# Altium schematic symbol library Library.SchLib: 802 symbols (part 4 of 8)
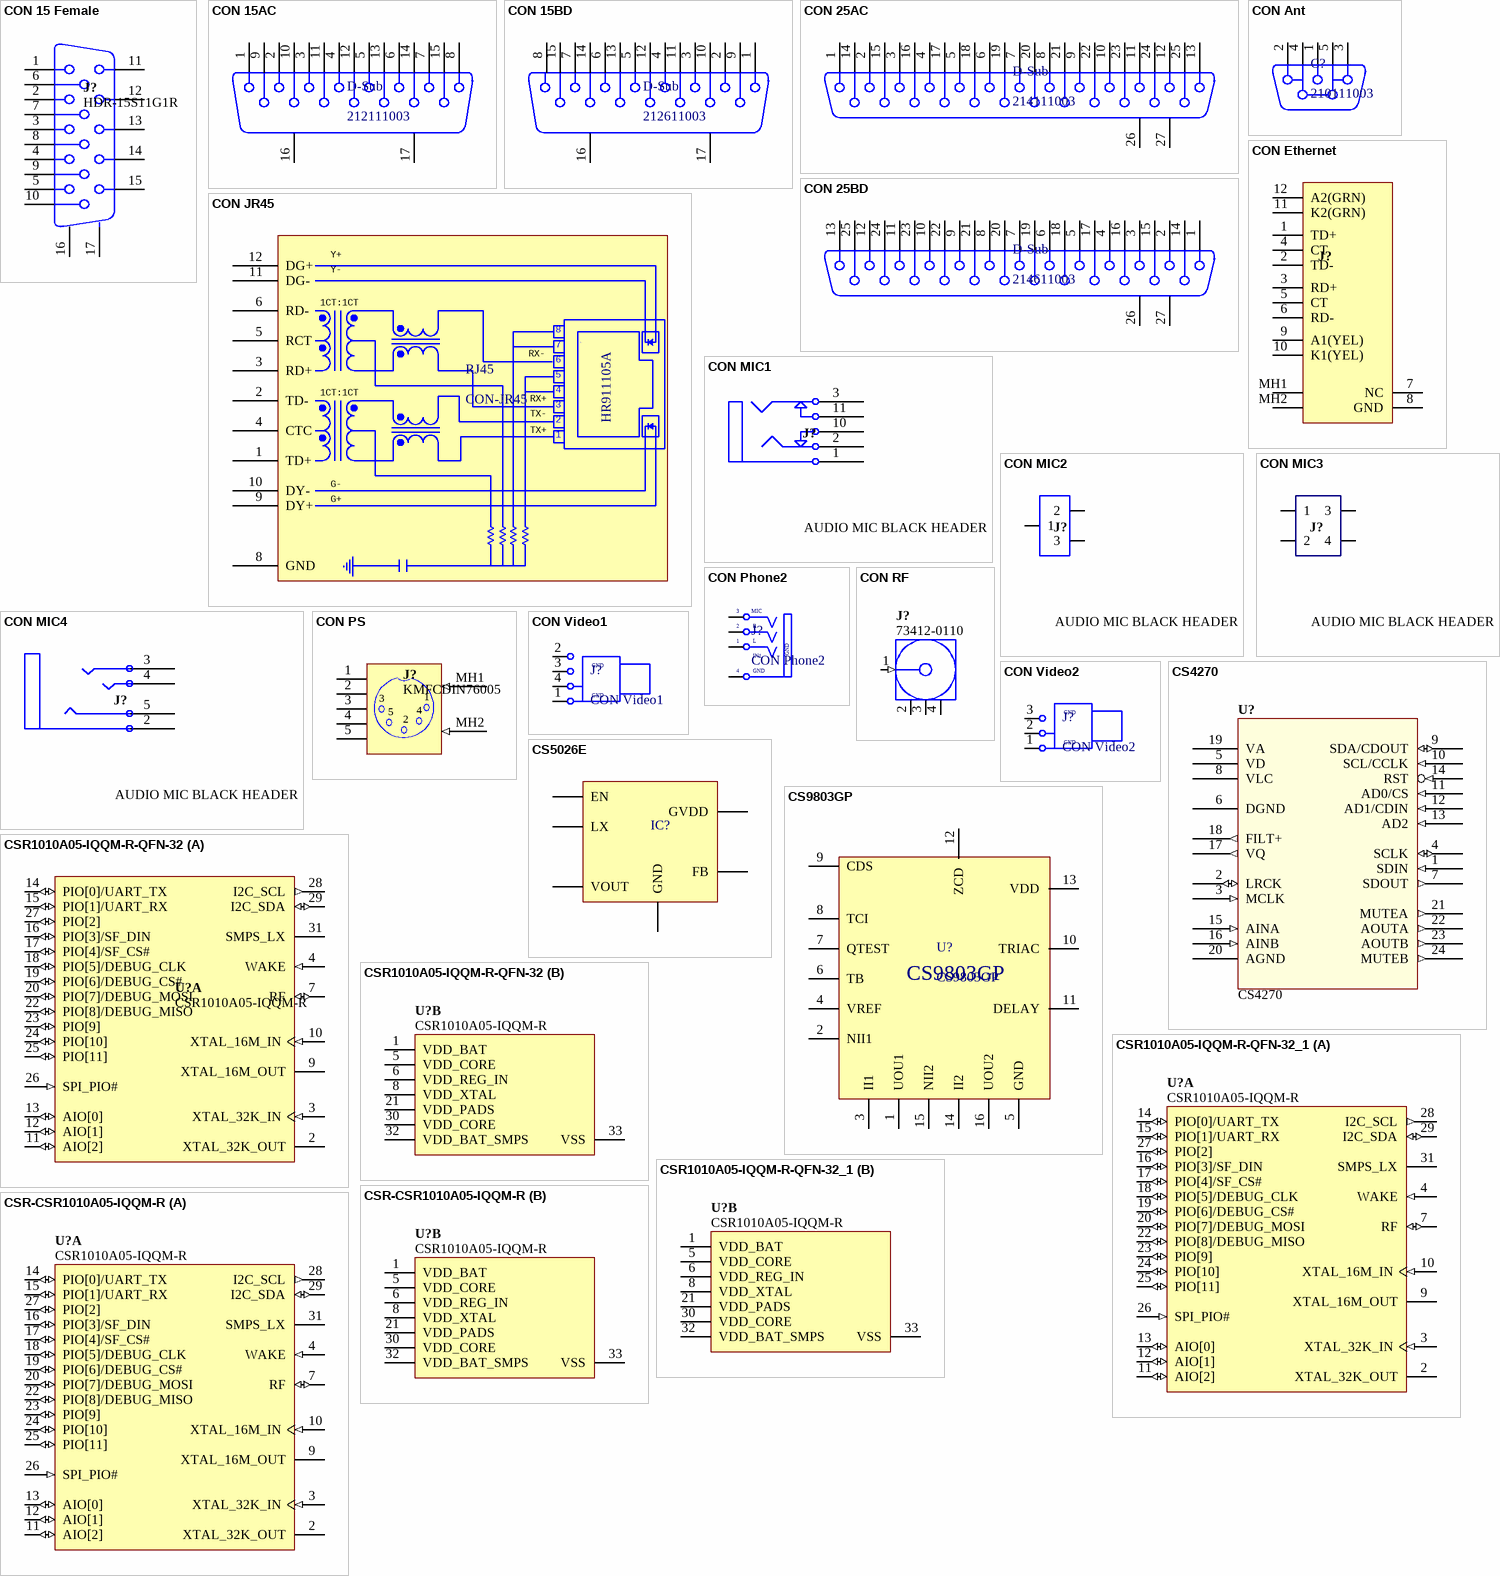
[diagram p52: symbols CON 15 Female to CSR-CSR1010A05-IQQM-R]

## CSR1010A05-IQQM-R-QFN-32
designator U?, comment CSR1010A05-IQQM-R
Bluetooth Low Energy Single-mode IC, 64 KB RAM and 64 KB ROM, -30 to 85 degC, 32-pin QFN; Manufacturer: CSR; Stop bits No.: 1 or 2; I/O Supply Voltage (VDD_PADS): 1.2 to 3.6 V; Digital IO No.: 12; Packing: Tape and Reel; Flow control: CTS / RTS; Bits per byte: 8; Baud Rate (max): 2Mbaud (<=1%Error); Baud Rate (min): 1200 baud (<=2%Error); ComponentLink2Description: Datasheet; ComponentLink2URL: https://www.csrsupport.com/download/39359/CSR1010%20Data%20Sheet%20CS-231985-DS.pdf; PartNumber: CSR1010A05-IQQM-R; DatasheetVersion: Rev. 4; Memory Size: 64KB RAM and 64KB ROM; ComponentLink3URL: https://www.csrsupport.com/download/39359/CSR1010%20Data%20Sheet%20CS-231985-DS.pdf; Mounting Technology: Surface Mount; Operating Temperature: -30 to 85 degC; PackageDescription: 32-Pin Quad Flat No-lead Package, Body 5x5mm, Pitch 0.5mm; ComponentLink1URL: http://csr.com/; PackageReference: QFN-32; ComponentLink3Description: Package Specification; ComponentLink1Description: Manufacturer URL
footprint QFN32 (QFN, 32-Leads, Body 5x5 mm, Pitch 0.5mm, IPC High Density)
part A pins: 2 XTAL_32K_OUT "Drive for sleep clock crystal.", 3 XTAL_32K_IN (in) "32.768kHz sleep clock input.", 4 WAKE (in) "Input to wake CSR1010 QFN from hibernate or dormant.", 7 RF (io) "Bluetooth transmitter / receiver.", 9 XTAL_16M_OUT "Drive for crystal.", 10 XTAL_16M_IN (in) "Reference clock input.", 11 AIO[2] (io) "Analogue programmable I/O line.", 12 AIO[1] (io) "Analogue programmable I/O line.", 13 AIO[0] (io) "Analogue programmable I/O line.", 14 PIO[0]/UART_TX (io) "Programmable I/O line or UART TX.", 15 PIO[1]/UART_RX (io) "Programmable I/O line or UART RX.", 16 PIO[3]/SF_DIN (io) "Programmable I/O line or SPI serial flash data (SF_DIN) input. If connecting to SPI serial flash, this pin connects to SI on the serial flash. See Section 5.3.", 17 PIO[4]/SF_CS# (io) "Programmable I/O line or SPI serial flash chip select (SF_CS#), see Section 5.3.", 18 PIO[5]/DEBUG_CLK (io) "Programmable I/O line or debug SPI CLK selected by SPI_PIO#.", 19 PIO[6]/DEBUG_CS# (io) "Programmable I/O line or debug SPI chip select (CS#) selected by SPI_PIO#.", 20 PIO[7]/DEBUG_MOSI (io) "Programmable I/O line or debug SPI MOSI selected by SPI_PIO#.", 22 PIO[8]/DEBUG_MISO (io) "Programmable I/O line or debug SPI MISO selected by SPI_PIO#.", 23 PIO[9] (io) "Programmable I/O line.", 24 PIO[10] (io) "Programmable I/O line.", 25 PIO[11] (io) "Programmable I/O line.", 26 SPI_PIO# (in) "Selects SPI debug on PIO[8:5].", 27 PIO[2] (io) "Programmable I/O line or I2C power.", 28 I2C_SCL (out) "I2C clock or SPI serial flash clock output (SF_CLK), see Section 5.3.", 29 I2C_SDA (io) "I2C data input / output or SPI serial flash data output (SF_DOUT). If connecting to SPI serial flash, connect this pin to SO on the serial flash. See Section 5.3.", 31 SMPS_LX (power) "High-voltage switch-mode regulator output."
part B pins: 1 VDD_BAT (power) "Battery input and regulator enable (active high).", 5 VDD_CORE (power) "Positive supply for digital domain.", 6 VDD_REG_IN (power) "Positive supply for Bluetooth radio and digital linear regulator.", 8 VDD_XTAL (power) "Decouple with 470nF capacitor to ground.", 21 VDD_PADS (power) "Positive supply for all digital I/O ports PIO[11:0].", 30 VDD_CORE (power) "Positive supply for digital domain.", 32 VDD_BAT_SMPS (power) "Input to high-voltage switch-mode regulator.", 33 VSS (power) "Ground connections."

## CSR1010A05-IQQM-R-QFN-32_1
designator U?, comment CSR1010A05-IQQM-R
Bluetooth Low Energy Single-mode IC, 64 KB RAM and 64 KB ROM, -30 to 85 degC, 32-pin QFN; Manufacturer: CSR; Stop bits No.: 1 or 2; I/O Supply Voltage (VDD_PADS): 1.2 to 3.6 V; Digital IO No.: 12; Packing: Tape and Reel; Flow control: CTS / RTS; Bits per byte: 8; Baud Rate (max): 2Mbaud (<=1%Error); Baud Rate (min): 1200 baud (<=2%Error); ComponentLink2Description: Datasheet; ComponentLink2URL: https://www.csrsupport.com/download/39359/CSR1010%20Data%20Sheet%20CS-231985-DS.pdf; PartNumber: CSR1010A05-IQQM-R; DatasheetVersion: Rev. 4; Memory Size: 64KB RAM and 64KB ROM; ComponentLink3URL: https://www.csrsupport.com/download/39359/CSR1010%20Data%20Sheet%20CS-231985-DS.pdf; Mounting Technology: Surface Mount; Operating Temperature: -30 to 85 degC; PackageDescription: 32-Pin Quad Flat No-lead Package, Body 5x5mm, Pitch 0.5mm; ComponentLink1URL: http://csr.com/; PackageReference: QFN-32; ComponentLink3Description: Package Specification; ComponentLink1Description: Manufacturer URL
footprint QFN32 (QFN, 32-Leads, Body 5x5 mm, Pitch 0.5mm, IPC High Density)
part A pins: 2 XTAL_32K_OUT "Drive for sleep clock crystal.", 3 XTAL_32K_IN (in) "32.768kHz sleep clock input.", 4 WAKE (in) "Input to wake CSR1010 QFN from hibernate or dormant.", 7 RF (io) "Bluetooth transmitter / receiver.", 9 XTAL_16M_OUT "Drive for crystal.", 10 XTAL_16M_IN (in) "Reference clock input.", 11 AIO[2] (io) "Analogue programmable I/O line.", 12 AIO[1] (io) "Analogue programmable I/O line.", 13 AIO[0] (io) "Analogue programmable I/O line.", 14 PIO[0]/UART_TX (io) "Programmable I/O line or UART TX.", 15 PIO[1]/UART_RX (io) "Programmable I/O line or UART RX.", 16 PIO[3]/SF_DIN (io) "Programmable I/O line or SPI serial flash data (SF_DIN) input. If connecting to SPI serial flash, this pin connects to SI on the serial flash. See Section 5.3.", 17 PIO[4]/SF_CS# (io) "Programmable I/O line or SPI serial flash chip select (SF_CS#), see Section 5.3.", 18 PIO[5]/DEBUG_CLK (io) "Programmable I/O line or debug SPI CLK selected by SPI_PIO#.", 19 PIO[6]/DEBUG_CS# (io) "Programmable I/O line or debug SPI chip select (CS#) selected by SPI_PIO#.", 20 PIO[7]/DEBUG_MOSI (io) "Programmable I/O line or debug SPI MOSI selected by SPI_PIO#.", 22 PIO[8]/DEBUG_MISO (io) "Programmable I/O line or debug SPI MISO selected by SPI_PIO#.", 23 PIO[9] (io) "Programmable I/O line.", 24 PIO[10] (io) "Programmable I/O line.", 25 PIO[11] (io) "Programmable I/O line.", 26 SPI_PIO# (in) "Selects SPI debug on PIO[8:5].", 27 PIO[2] (io) "Programmable I/O line or I2C power.", 28 I2C_SCL (out) "I2C clock or SPI serial flash clock output (SF_CLK), see Section 5.3.", 29 I2C_SDA (io) "I2C data input / output or SPI serial flash data output (SF_DOUT). If connecting to SPI serial flash, connect this pin to SO on the serial flash. See Section 5.3.", 31 SMPS_LX (power) "High-voltage switch-mode regulator output."
part B pins: 1 VDD_BAT (power) "Battery input and regulator enable (active high).", 5 VDD_CORE (power) "Positive supply for digital domain.", 6 VDD_REG_IN (power) "Positive supply for Bluetooth radio and digital linear regulator.", 8 VDD_XTAL (power) "Decouple with 470nF capacitor to ground.", 21 VDD_PADS (power) "Positive supply for all digital I/O ports PIO[11:0].", 30 VDD_CORE (power) "Positive supply for digital domain.", 32 VDD_BAT_SMPS (power) "Input to high-voltage switch-mode regulator.", 33 VSS (power) "Ground connections."

## CSR-CSR1010A05-IQQM-R
designator U?, comment CSR1010A05-IQQM-R
Bluetooth Low Energy Single-mode IC, 64 KB RAM and 64 KB ROM, -30 to 85 degC, 32-pin QFN; Manufacturer: CSR; Stop bits No.: 1 or 2; I/O Supply Voltage (VDD_PADS): 1.2 to 3.6 V; Digital IO No.: 12; Packing: Tape and Reel; Flow control: CTS / RTS; Bits per byte: 8; Baud Rate (max): 2Mbaud (<=1%Error); Baud Rate (min): 1200 baud (<=2%Error); ComponentLink2Description: Datasheet; ComponentLink2URL: https://www.csrsupport.com/download/39359/CSR1010%20Data%20Sheet%20CS-231985-DS.pdf; PartNumber: CSR1010A05-IQQM-R; DatasheetVersion: Rev. 4; Memory Size: 64KB RAM and 64KB ROM; ComponentLink3URL: https://www.csrsupport.com/download/39359/CSR1010%20Data%20Sheet%20CS-231985-DS.pdf; Mounting Technology: Surface Mount; Operating Temperature: -30 to 85 degC; PackageDescription: 32-Pin Quad Flat No-lead Package, Body 5x5mm, Pitch 0.5mm; ComponentLink1URL: http://csr.com/; PackageReference: QFN-32; ComponentLink3Description: Package Specification; ComponentLink1Description: Manufacturer URL
footprint QFN32 (QFN, 32-Leads, Body 5x5 mm, Pitch 0.5mm, IPC High Density)
part A pins: 2 XTAL_32K_OUT "Drive for sleep clock crystal.", 3 XTAL_32K_IN (in) "32.768kHz sleep clock input.", 4 WAKE (in) "Input to wake CSR1010 QFN from hibernate or dormant.", 7 RF (io) "Bluetooth transmitter / receiver.", 9 XTAL_16M_OUT "Drive for crystal.", 10 XTAL_16M_IN (in) "Reference clock input.", 11 AIO[2] (io) "Analogue programmable I/O line.", 12 AIO[1] (io) "Analogue programmable I/O line.", 13 AIO[0] (io) "Analogue programmable I/O line.", 14 PIO[0]/UART_TX (io) "Programmable I/O line or UART TX.", 15 PIO[1]/UART_RX (io) "Programmable I/O line or UART RX.", 16 PIO[3]/SF_DIN (io) "Programmable I/O line or SPI serial flash data (SF_DIN) input. If connecting to SPI serial flash, this pin connects to SI on the serial flash. See Section 5.3.", 17 PIO[4]/SF_CS# (io) "Programmable I/O line or SPI serial flash chip select (SF_CS#), see Section 5.3.", 18 PIO[5]/DEBUG_CLK (io) "Programmable I/O line or debug SPI CLK selected by SPI_PIO#.", 19 PIO[6]/DEBUG_CS# (io) "Programmable I/O line or debug SPI chip select (CS#) selected by SPI_PIO#.", 20 PIO[7]/DEBUG_MOSI (io) "Programmable I/O line or debug SPI MOSI selected by SPI_PIO#.", 22 PIO[8]/DEBUG_MISO (io) "Programmable I/O line or debug SPI MISO selected by SPI_PIO#.", 23 PIO[9] (io) "Programmable I/O line.", 24 PIO[10] (io) "Programmable I/O line.", 25 PIO[11] (io) "Programmable I/O line.", 26 SPI_PIO# (in) "Selects SPI debug on PIO[8:5].", 27 PIO[2] (io) "Programmable I/O line or I2C power.", 28 I2C_SCL (out) "I2C clock or SPI serial flash clock output (SF_CLK), see Section 5.3.", 29 I2C_SDA (io) "I2C data input / output or SPI serial flash data output (SF_DOUT). If connecting to SPI serial flash, connect this pin to SO on the serial flash. See Section 5.3.", 31 SMPS_LX (power) "High-voltage switch-mode regulator output."
part B pins: 1 VDD_BAT (power) "Battery input and regulator enable (active high).", 5 VDD_CORE (power) "Positive supply for digital domain.", 6 VDD_REG_IN (power) "Positive supply for Bluetooth radio and digital linear regulator.", 8 VDD_XTAL (power) "Decouple with 470nF capacitor to ground.", 21 VDD_PADS (power) "Positive supply for all digital I/O ports PIO[11:0].", 30 VDD_CORE (power) "Positive supply for digital domain.", 32 VDD_BAT_SMPS (power) "Input to high-voltage switch-mode regulator.", 33 VSS (power) "Ground connections."

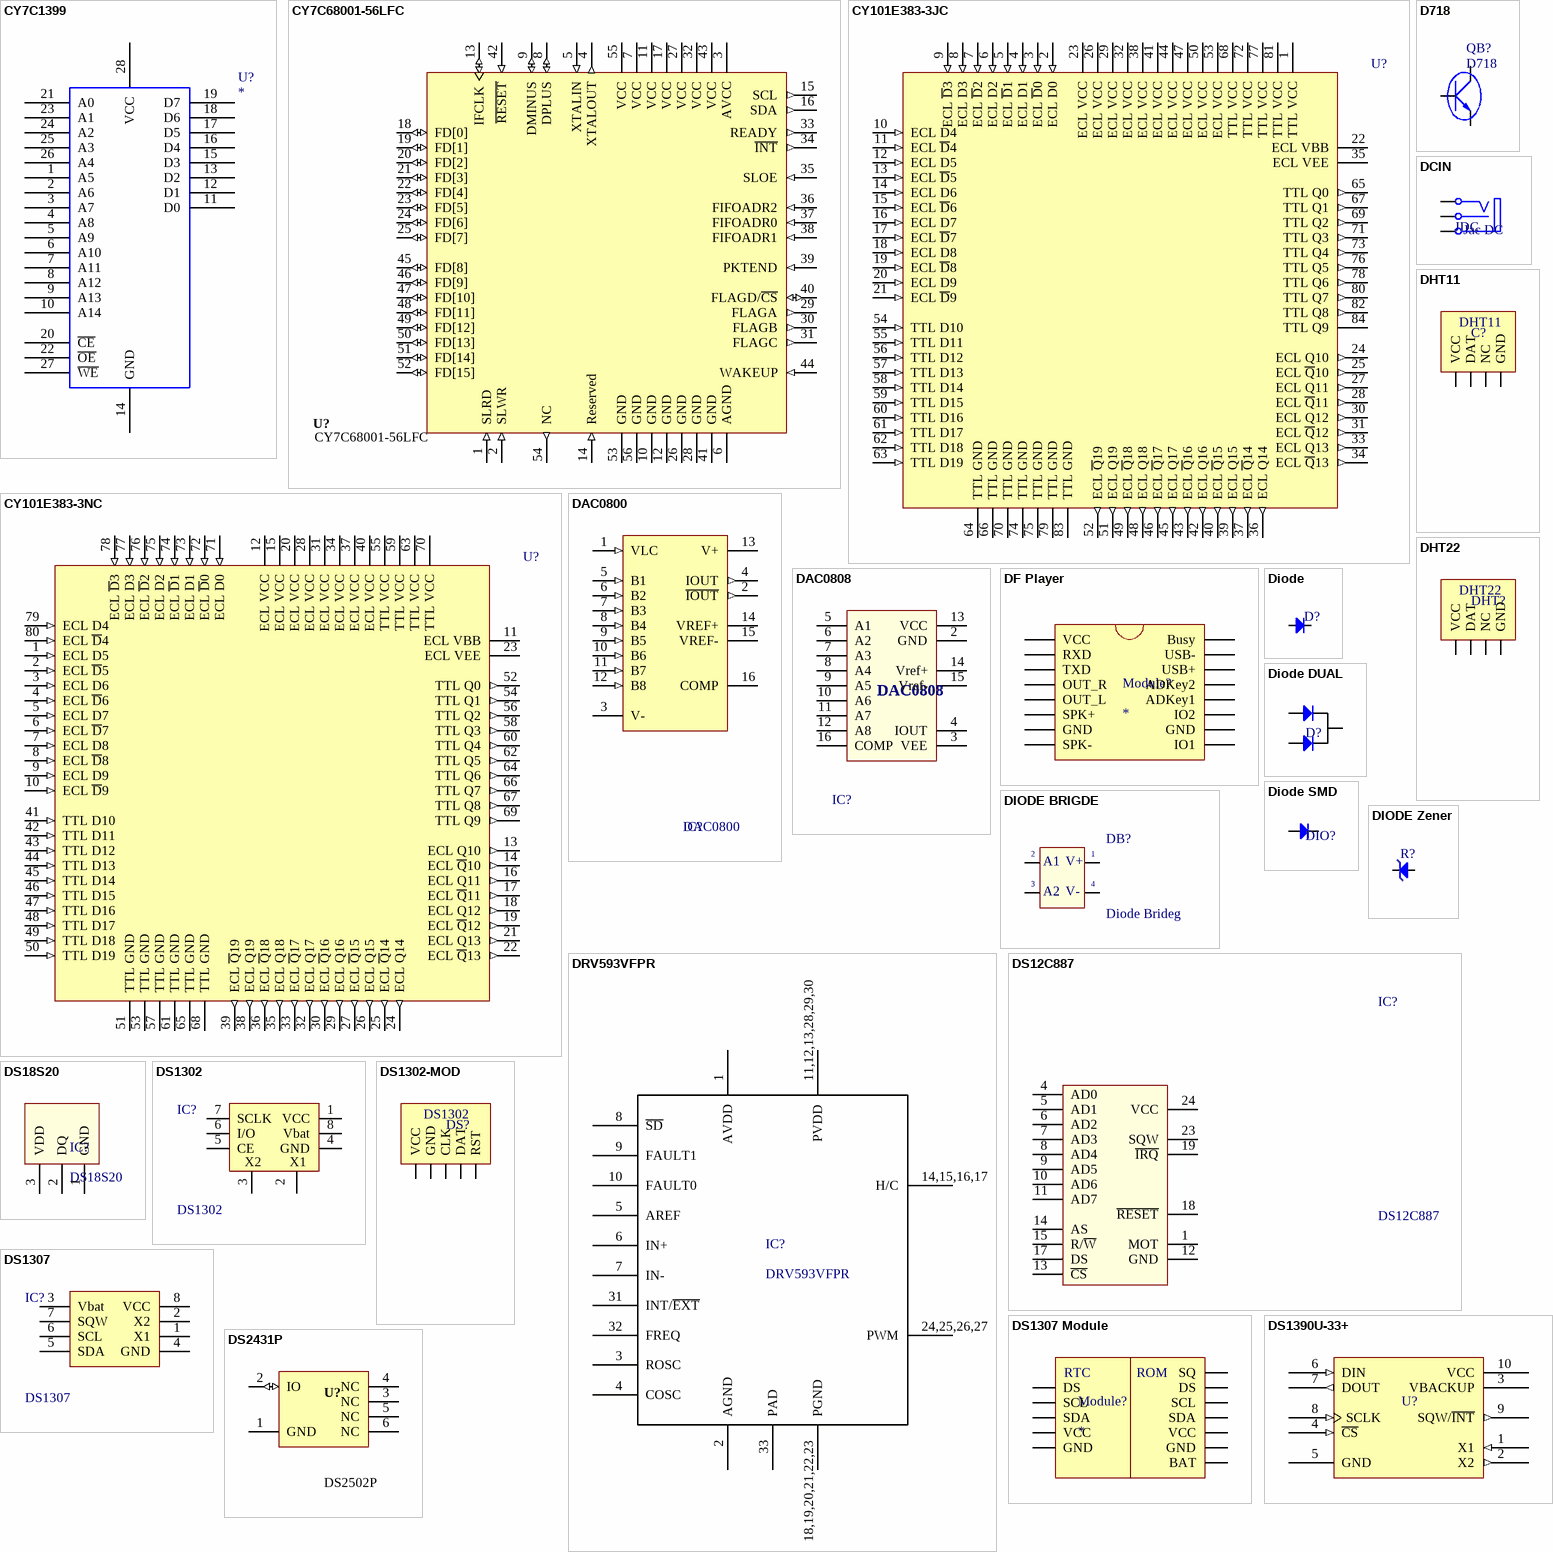
[diagram p20: symbols CY7C1399 to DS2431P]

## CY7C1399
designator U?
32K ASYNCHRONOUS SRAM
footprint SO28 (SOP, 28-Leads, Body 18.1x8.6mm, Pitch 1.27mm, IPC Low Density)
pins: 1 A5, 2 A6, 3 A7, 4 A8, 5 A9, 6 A10, 7 A11, 8 A12, 9 A13, 10 A14, 11 D0, 12 D1, 13 D2, 14 GND, 15 D3, 16 D4, 17 D5, 18 D6, 19 D7, 20 ~{CE}, 21 A0, 22 ~{OE}, 23 A1, 24 A2, 25 A3, 26 A4, 27 ~{WE}, 28 VCC

## CY7C68001-56LFC
designator U?
CY7C68001-56LFC, EZ-USB SX2 High-Speed USB Interface; Comm Standard: None; Category: IC-Communication; Mounting Technology: Surface Mount; Status: Production
footprint QFN56 (QFN, 56-Leads, Body 8.00x8.00mm, Pitch 0.50mm, Thermal Pad 6.40x6.40mm, IPC Medium Density)
pins: 1 SLRD (in), 2 SLWR (in), 3 AVCC (power), 4 XTALOUT (out), 5 XTALIN (in), 6 AGND (power), 7 VCC (power), 8 DPLUS (io), 9 DMINUS (io), 10 GND (power), 11 VCC (power), 12 GND (power), 13 IFCLK (io), 14 Reserved (in), 15 SCL (out), 16 SDA (out), 17 VCC (power), 18 FD[0] (io), 19 FD[1] (io), 20 FD[2] (io), 21 FD[3] (io), 22 FD[4] (io), 23 FD[5] (io), 24 FD[6] (io), 25 FD[7] (io), 26 GND (power), 27 VCC (power), 28 GND (power), 29 FLAGA (out), 30 FLAGB (out), 31 FLAGC (out), 32 VCC (power), 33 READY (out), 34 ~{INT} (out), 35 SLOE (in), 36 FIFOADR2 (in), 37 FIFOADR0 (in), 38 FIFOADR1 (in), 39 PKTEND (in), 40 FLAGD/~{CS} (io), 41 GND (power), 42 ~{RESET} (in), 43 VCC (power), 44 WAKEUP (in), 45 FD[8] (io), 46 FD[9] (io), 47 FD[10] (io), 48 FD[11] (io), 49 FD[12] (io), 50 FD[13] (io), 51 FD[14] (io), 52 FD[15] (io), 53 GND (power), 54 NC (out), 55 VCC (power), 56 GND (power)

## CY101E383-3JC
designator U?
ECL/TTL/ECL Translator and High-Speed Bus Driver; Published: 11-Dec-2002; LatestRevisionDate: 13-Apr-2006; LatestRevisionNote: IPC-7351 Footprint Added.; DatasheetVersion: 11-Apr-1997; PackageVersion: Mar-2001; PackageReference: J83; Publisher: Altium Limited; PackageDescription: 84-Pin Plastic Leaded Chip Carrier 1.27 mm Pitch; Code_IPC: PLCC-84; ComponentLink1Description: Manufacturer Link; ComponentLink1URL: http://www.cypress.com/
footprint LCC84 (Leaded Chip Carrier, 84-Leads, Body 29.3x29.3mm, Pitch 1.27mm, IPC High Density)
pins: 1 TTL VCC (power), 2 ECL D0 (in), 3 ECL ~{D}0 (in), 4 ECL D1 (in), 5 ECL ~{D}1 (in), 6 ECL D2 (in), 7 ECL ~{D}2 (in), 8 ECL D3 (in), 9 ECL ~{D}3 (in), 10 ECL D4 (in), 11 ECL ~{D}4 (in), 12 ECL D5 (in), 13 ECL ~{D}5 (in), 14 ECL D6 (in), 15 ECL ~{D}6 (in), 16 ECL D7 (in), 17 ECL ~{D}7 (in), 18 ECL D8 (in), 19 ECL ~{D}8 (in), 20 ECL D9 (in), 21 ECL ~{D}9 (in), 22 ECL VBB (power), 23 ECL VCC (power), 24 ECL Q10 (out), 25 ECL ~{Q}10 (out), 26 ECL VCC (power), 27 ECL Q11 (out), 28 ECL ~{Q}11 (out), 29 ECL VCC (power), 30 ECL Q12 (out), 31 ECL ~{Q}12 (out), 32 ECL VCC (power), 33 ECL Q13 (out), 34 ECL ~{Q}13 (out), 35 ECL VEE (power), 36 ECL Q14 (out), 37 ECL ~{Q}14 (out), 38 ECL VCC (power), 39 ECL Q15 (out), 40 ECL ~{Q}15 (out), 41 ECL VCC (power), 42 ECL Q16 (out), 43 ECL ~{Q}16 (out), 44 ECL VCC (power), 45 ECL Q17 (out), 46 ECL ~{Q}17 (out), 47 ECL VCC (power), 48 ECL Q18 (out), 49 ECL ~{Q}18 (out), 50 ECL VCC (power), 51 ECL Q19 (out), 52 ECL ~{Q}19 (out), 53 ECL VCC (power), 54 TTL D10 (in), 55 TTL D11 (in), 56 TTL D12 (in), 57 TTL D13 (in), 58 TTL D14 (in), 59 TTL D15 (in), 60 TTL D16 (in), 61 TTL D17 (in), 62 TTL D18 (in), 63 TTL D19 (in), 64 TTL GND (power), 65 TTL Q0 (out), 66 TTL GND (power), 67 TTL Q1 (out), 68 TTL VCC (power), 69 TTL Q2 (out), 70 TTL GND (power), 71 TTL Q3 (out), 72 TTL VCC (power), 73 TTL Q4 (out), 74 TTL GND (power), 75 TTL GND (power), 76 TTL Q5 (out), 77 TTL VCC (power), 78 TTL Q6 (out), 79 TTL GND (power), 80 TTL Q7 (out), 81 TTL VCC (power), 82 TTL Q8 (out), 83 TTL GND (power), 84 TTL Q9 (power)

## CY101E383-3NC
designator U?
ECL/TTL/ECL Translator and High-Speed Bus Driver; Published: 11-Dec-2002; LatestRevisionDate: 13-Apr-2006; LatestRevisionNote: IPC-7351 Footprint Added.; DatasheetVersion: 11-Apr-1997; PackageVersion: Apr-1997; PackageReference: N80; Publisher: Altium Limited; PackageDescription: 80-Pin Plastic Quad Flat Pack 0.65 mm Pitch; Code_IPC: QFP65P1720X1720-80; ComponentLink1Description: Manufacturer Link; ComponentLink1URL: http://www.cypress.com/
footprint QFP80 (QFP, 80-Leads, Body 14 x 14mm, Pitch 0.65mm, IPC High Density)
pins: 1 ECL D5 (in), 2 ECL ~{D}5 (in), 3 ECL D6 (in), 4 ECL ~{D}6 (in), 5 ECL D7 (in), 6 ECL ~{D}7 (in), 7 ECL D8 (in), 8 ECL ~{D}8 (in), 9 ECL D9 (in), 10 ECL ~{D}9 (in), 11 ECL VBB (power), 12 ECL VCC (power), 13 ECL Q10 (out), 14 ECL ~{Q}10 (out), 15 ECL VCC (power), 16 ECL Q11 (out), 17 ECL ~{Q}11 (out), 18 ECL Q12 (out), 19 ECL ~{Q}12 (out), 20 ECL VCC (power), 21 ECL Q13 (out), 22 ECL ~{Q}13 (out), 23 ECL VEE (power), 24 ECL Q14 (out), 25 ECL ~{Q}14 (out), 26 ECL Q15 (out), 27 ECL ~{Q}15 (out), 28 ECL VCC (power), 29 ECL Q16 (out), 30 ECL ~{Q}16 (out), 31 ECL VCC (power), 32 ECL Q17 (out), 33 ECL ~{Q}17 (out), 34 ECL VCC (power), 35 ECL Q18 (out), 36 ECL ~{Q}18 (out), 37 ECL VCC (power), 38 ECL Q19 (out), 39 ECL ~{Q}19 (out), 40 ECL VCC (power), 41 TTL D10 (in), 42 TTL D11 (in), 43 TTL D12 (in), 44 TTL D13 (in), 45 TTL D14 (in), 46 TTL D15 (in), 47 TTL D16 (in), 48 TTL D17 (in), 49 TTL D18 (in), 50 TTL D19 (in), 51 TTL GND (power), 52 TTL Q0 (out), 53 TTL GND (power), 54 TTL Q1 (out), 55 TTL VCC (power), 56 TTL Q2 (out), 57 TTL GND (power), 58 TTL Q3 (out), 59 TTL VCC (power), 60 TTL Q4 (out), 61 TTL GND (power), 62 TTL Q5 (out), 63 TTL VCC (power), 64 TTL Q6 (out), 65 TTL GND (power), 66 TTL Q7 (out), 67 TTL Q8 (out), 68 TTL GND (power), 69 TTL Q9 (out), 70 TTL VCC (power), 71 ECL D0 (in), 72 ECL ~{D}0 (in), 73 ECL D1 (in), 74 ECL ~{D}1 (in), 75 ECL D2 (in), 76 ECL ~{D}2 (in), 77 ECL D3 (in), 78 ECL ~{D}3 (in), 79 ECL D4 (in), 80 ECL ~{D}4 (in)

## D718
designator QB?
Transistor Power Supply; Value: D718
footprint TO247+LageHeatsink
footprint TO247
footprint TO247D
footprint TO247h
pins: 1 B, 2 C, 3 E

## DAC0800
designator IC?
8-Bit Digital-to-Analog Converter; Value: DAC0800
footprint DIP16
footprint SO16 (SOIC, 16-Leads, Body 9.90x3.91mm, Pitch 1.27mm, IPC Medium Density)
pins: 1 VLC (in), 2 ~{IOUT} (out), 3 V- (power), 4 IOUT (out), 5 B1 (in), 6 B2 (in), 7 B3 (in), 8 B4 (in), 9 B5 (in), 10 B6 (in), 11 B7 (in), 12 B8 (in), 13 V+ (power), 14 VREF+, 15 VREF-, 16 COMP

## DAC0808
designator IC?
8 Bits Digital Analog Convert; Value: DAC0808
footprint DIP16
footprint SO16 (SOIC, 16-Leads, Body 9.9x3.9mm, Pitch 1.27mm, IPC High Density)
pins: 2 GND, 3 VEE, 4 IOUT, 5 A1, 6 A2, 7 A3, 8 A4, 9 A5, 10 A6, 11 A7, 12 A8, 13 VCC (power), 14 Vref+, 15 Vref-, 16 COMP
2 alternate drawings of the same symbol

## DCIN
designator JDC, comment Jac DC
Jac DC input; Value: Jac DC
footprint DC0 (Jac DC input)
footprint DC1 (WR-DC_DC Power Jack_Right Angled_THT Center Pin ?0.65_Plug ID ?0.75_Plug OD ?2.35_with Peg)
footprint DC2 (WR-DC_DC Power Jack_Vertical_THT WR-DC_DC Power Jack_Vertical_THT)
footprint DC3 (WR-DC_DC Power Jack_Vertical_THT Center Pin ?2.5_Plug ID ?2.55_Plug OD ?5.5)
footprint DC4 (WR-DC_DC Power Jack_Right Angled_THT Center Pin ?1.0_Plug ID ?1.05_Plug OD ?3.5_with Peg)
footprint DC5 (WR-DC_DC Power Jack_Right Angled_THT Center Pin ?1.3_Plug ID ?1.35_Plug OD ?3.5_with Peg)
pins: 1 S (power) "Sleeve (Ground)", 2 TN "Tip Normal (Break Contact)", 3 T "Tip"

## DF Player
designator Module?
footprint DFPlayer
pins: 1 VCC, 2 RXD, 3 TXD, 4 OUT_R, 5 OUT_L, 6 SPK+, 7 GND, 8 SPK-, 9 IO1, 10 GND, 11 IO2, 12 ADKey1, 13 ADKey2, 14 USB+, 15 USB-, 16 Busy

## DHT11
designator C?
Manufacturer: W¨¹rth Elektronik eiSos GmbH; partNo: 613004143121; ComponentLink1 Description: Manufacturer; ComponentLink2 Description: Datasheet; NoPins: 04; Created Date: 29 March 2013; ComponentLink1URL: http://www.we-online.com; ComponentLink2URL: http://katalog.we-online.de/em/datasheet/6130xx143121.pdf; Created by: Karrer Zheng
footprint DHT11
footprint JP4-C1T (4 row, straight, gold plating)
pins: 1 VCC, 2 DAT, 3 NC, 4 GND

## DHT22
designator DHT?
Manufacturer: W¨¹rth Elektronik eiSos GmbH; partNo: 613004143121; ComponentLink1 Description: Manufacturer; ComponentLink2 Description: Datasheet; NoPins: 04; Created Date: 29 March 2013; ComponentLink1URL: http://www.we-online.com; ComponentLink2URL: http://katalog.we-online.de/em/datasheet/6130xx143121.pdf; Created by: Karrer Zheng
footprint DHT22
footprint DHT22-SMD
footprint JP4-C1T (4 row, straight, gold plating)
pins: 1 VCC, 2 DAT, 3 NC, 4 GND

## Diode
designator D?  (value not drawn)
Default Diode; Code - JEDEC: DO-214-AB; Value: 1N5007; Published: 8-Jun-2000; Revision: July-2002: Re-released for DXP Platform.; Publisher: Altium Limited
footprint DIO-1A
footprint DIO-0.5A-SMALL (Diode muoi, W 80mil, L 300mil)
footprint DIO-1A-SMALL (Diode 1A, W 100mil, L 350mil)
footprint DIO-2A (Diode 2A, W 150mil, L 450mil)
footprint DIO-5A (Diode 5A, W 200mil, L 550mil)
footprint DIO-5AN (Diode 5A, W 200mil, L 250mil)
footprint DIO-1AN (Diode 1A, W 100mil, L 150mil)
footprint DIO-3A (Diode 3A)
footprint DIO-2A - LONG (Diode 2A, W 150mil, L 450mil)
footprint DIO-2AN (Diode 2A, W 150mil, L 450mil)
footprint DIO-5A - LONG (Diode 5A, W 200mil, L 550mil)
footprint DIO-7A-SMALL (Diode 7A)
pins: 1 A, 2 K

## DIODE BRIGDE
designator DB?, comment Diode Brideg
Convert AC to DC voltage, 4 pin; Value: Cau 1A
footprint DIO-Bri 5A (Brigde 5A)
footprint DIO-Bri 1A
footprint DIO-Bri 2A (CAU 2A DET)
footprint DIO-BRI 35A (35A/1000V)
footprint DIO-Bri 10A (Brigde 10A)
footprint DIO-Bri 6A (Brigde 6A)
footprint DIO-Bri 8A (Brigde 8A)
footprint MB6S
pins: 1 +V OUT, 2 AC1, 3 AC2, 4 -V OUT
text: A1; V+; A2; V-

## Diode DUAL
designator D?  (value not drawn)
Default Diode; Code - JEDEC: DO-214-AB; Value: 1N5007; Published: 8-Jun-2000; Revision: July-2002: Re-released for DXP Platform.; Publisher: Altium Limited
footprint TO252-123
footprint TO220H2 (TO-220 - 1-2-3)
footprint TO220H1 (TO-220 - 1-2-3)
footprint TO220H3 (TO-220 1-2-3)
footprint TO247
footprint TO220-123 (TO-220 - 1-2-3)
footprint TO247+LageHeatsink
pins: 1, 2, 3

## Diode SMD
designator DIO?
Default Diode; Code - JEDEC: DO-214-AB; Value: 1N5007; Published: 8-Jun-2000; Revision: July-2002: Re-released for DXP Platform.; Publisher: Altium Limited
footprint DIO-SMD-106
footprint DIO-SMD-123
footprint DIO-SMD-A
footprint DIO-SMD-B (Magnetic-Core Inductor with Winding Polarity Marking; 2 Leads)
footprint DIO-SMD-216AA (DO216AA ST-MITE)
footprint DIO-SMD-222AA (DO216AA ST-MITE)
footprint DIO-SMD-C
pins: 1 A, 2 K

## DIODE Zener
designator R?
Zenner
footprint DIO-0.5A-SMALL (Diode muoi, W 80mil, L 300mil)
footprint DIO-1A
footprint DIO-1A-SMALL (Diode 1A, W 100mil, L 350mil)
footprint DIO-1AN (Diode 1A, W 100mil, L 150mil)
footprint DIO-2A (Diode 2A, W 150mil, L 450mil)
footprint DIO-2A - LONG (Diode 2A, W 150mil, L 450mil)
footprint DIO-1A-ZEN (Diode 1A, W 100mil, L 350mil)
footprint DIO-2A-ZEN
pins: 1 A, 2 K

## DRV593VFPR
designator IC?
IC PWM PWR DRVR HI-EFF 32-HLQFP,  P/N: DRV593VFPR
footprint S-PQFP-G32
pins: 1 AVDD, 2 AGND, 3 ROSC, 4 COSC, 5 AREF, 6 IN+, 7 IN-, 8 ~{SD}, 9 FAULT1, 10 FAULT0, 11,12,13,28,29,30 PVDD, 14,15,16,17 H/C, 18,19,20,21,22,23 PGND, 24,25,26,27 PWM, 31 INT/~{EXT}, 32 FREQ, 33 PAD

## DS12C887
designator IC?
Real Timer Parallel; Value: DS12C887
footprint DIP24/W0.6 (DIP24/W.600, Pin to pin 100mil)
pins: 1 MOT, 4 AD0, 5 AD1, 6 AD2, 7 AD3, 8 AD4, 9 AD5, 10 AD6, 11 AD7, 12 GND, 13 ~{CS}, 14 AS, 15 R/~{W}, 17 DS, 18 ~{RESET}, 19 ~{IRQ}, 23 SQW, 24 VCC

## DS18S20
designator IC?
High Precision  1-Wire® Digital Thermometer
footprint JP3-C1T (3 row, straight, gold plating)
footprint TO92-321 (TO-92)
pins: 1 GND, 2 DQ, 3 VDD

## DS1302
designator IC?
Real Timer Serial - 2=>5V; Value: DS1307
footprint DIP8
footprint SO8
pins: 1 VCC, 2 X1, 3 X2, 4 GND, 5 CE, 6 I/O, 7 SCLK, 8 Vbat

## DS1302-MOD
designator DS?
Manufacturer: W¨¹rth Elektronik eiSos GmbH; partNo: 613004143121; ComponentLink1 Description: Manufacturer; ComponentLink2 Description: Datasheet; NoPins: 04; Created Date: 29 March 2013; ComponentLink1URL: http://www.we-online.com; ComponentLink2URL: http://katalog.we-online.de/em/datasheet/6130xx143121.pdf; Created by: Karrer Zheng
footprint ds1302
footprint JP5-C1T (5 row, straight, gold plating)
pins: 1 VCC, 2 GND, 3 CLK, 4 DAT, 5 RST
text: DS1302

## DS1307
designator IC?
Real Timer Serial; Value: DS1307
footprint DIP8
footprint SO8
pins: 1 X1, 2 X2, 3 Vbat, 4 GND, 5 SDA, 6 SCL, 7 SQW, 8 VCC

## DS1307 Module
designator Module?
footprint DS1307_RTC
pins: 1 DS, 2 SCL, 3 SDA, 4 VCC, 5 GND, 6 BAT, 7 GND, 8 VCC, 9 SDA, 10 SCL, 11 DS, 12 SQ
text: RTC; ROM

## DS1390U-33+
designator U?
Low-Voltage SPI/3-Wire Real-time Clock with Trickle Charger; Published: 30-May-2008; DatasheetVersion: Rev 1; 1/07; PackageVersion: revJ, Oct-2007; PackageReference: 10uSOP; Publisher: Altium Limited; PackageDescription: 10-Pin Thin Shrink Small Outline Package 0.5 mm Pitch; Code_JEDEC: MO-187C-BA; ComponentLink1Description: Manufacturer Link; ComponentLink1URL: http://www.maxim-ic.com/; ComponentLink2Description: Datasheet; ComponentLink2URL: http://datasheets.maxim-ic.com/en/ds/DS1390-DS1393.pdf
footprint TSSOP10 (TSSOP, 10-Leads, Body 3x3mm, Pitch 0.5mm, IPC High Density)
pins: 1 X1 (in), 2 X2 (out), 3 VBACKUP (power), 4 ~{CS} (in), 5 GND (power), 6 DIN (in), 7 DOUT (out), 8 SCLK (in), 9 SQW/~{INT} (out), 10 VCC (power)

## DS2431P
designator U?, comment DS2502P
EPROM, 1-wire, 1024-bit, Surface Mount; Bit Length: Bits; Speed: 15.4 or 125 kbps ps; Supply Voltage: 2.8 to 6 V; Bit Width: Bits; Mounting Technology: Surface Mount; Status: Unreleased; Technology: EE; Temperature Range: -40 to +85 degC; Category: IC-PROM
footprint SO6-J (SOJ, 6-Leads, Body 4.00x4.30mm, Pitch 1.27mm, IPC Low Density)
pins: 1 GND (power), 2 IO (io), 3 NC, 4 NC, 5 NC, 6 NC
